# Altium integrated library FOC_64.IntLib: 72 symbols
Pins are listed as number, name and electrical type; pins without a type are passive.

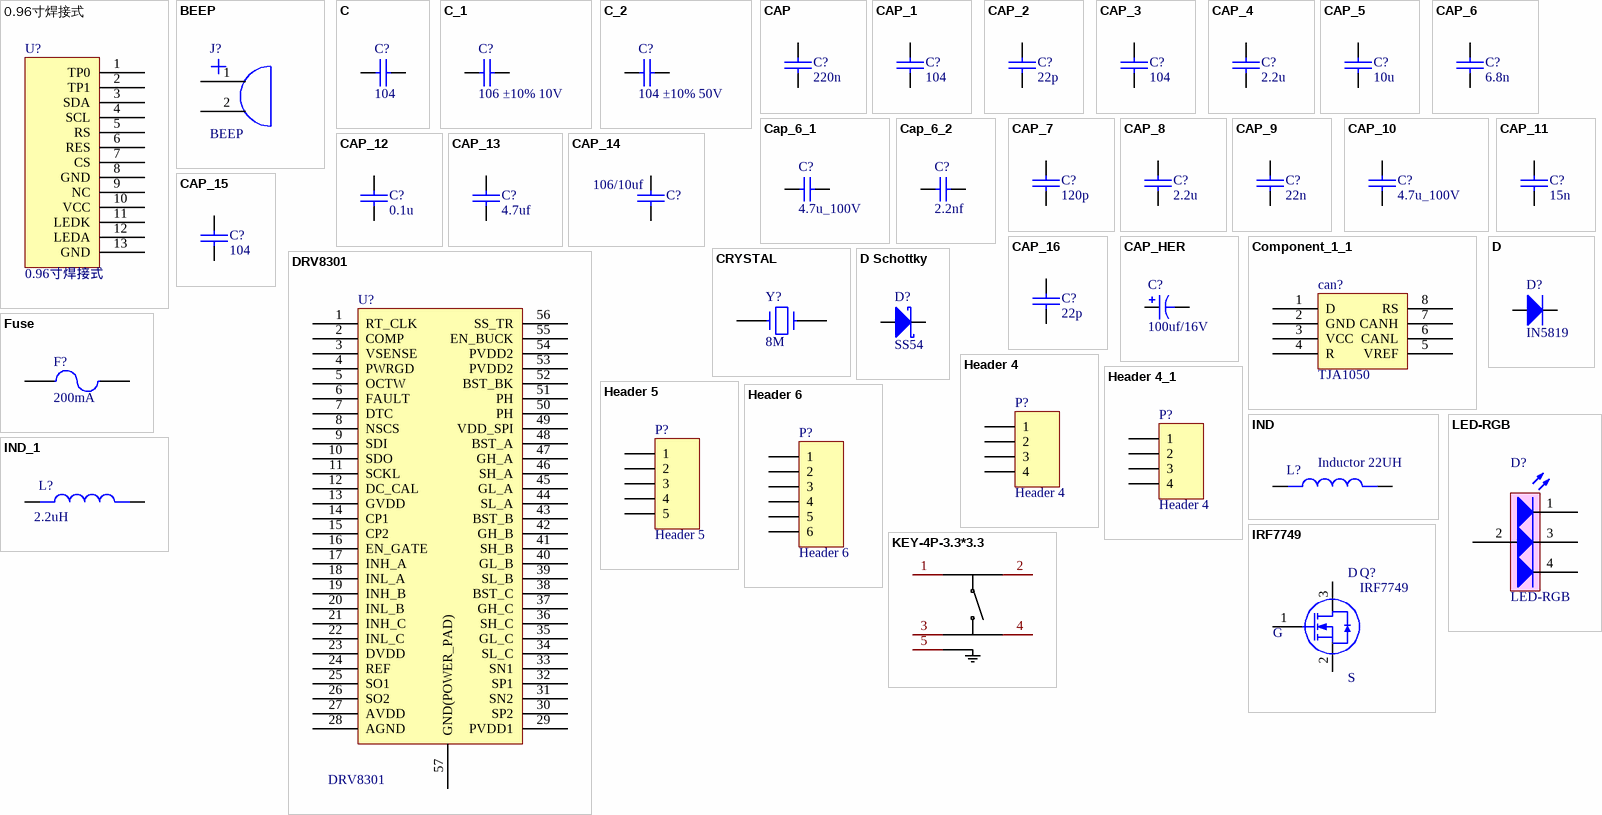
[diagram p0: symbols 0.96寸焊接式 to LED-RGB]

## 0.96寸焊接式
designator U?
footprint 13PIN-LCD
pins: 1 TP0, 2 TP1, 3 SDA, 4 SCL, 5 RS, 6 RES, 7 CS, 8 GND, 9 NC, 10 VCC, 11 LEDK, 12 LEDA, 13 GND

## BEEP
designator J?
蜂鸣器
footprint BUZZER_12.0X8.5MM
footprint 无源蜂鸣器5020
pins: 1 0, 2 1

## C
designator C?, comment 104
Capacitor
footprint cc0805
footprint 0805
footprint 0603
footprint C0603
footprint C0603-L
footprint c0805
footprint 0603_C (Capacitor)
footprint 0402
footprint 0402C
pins: 1, 2

## C_1
designator C?, comment 106 ±10% 10V
Capacitor
footprint cc0805
footprint 0805
footprint 0603
footprint C0603
footprint C0603-L
footprint c0805
footprint 0603_C (Capacitor)
footprint 0402
footprint 0402C
pins: 1, 2

## C_2
designator C?, comment 104 ±10% 50V
Capacitor
footprint cc0805
footprint 0805
footprint 0603
footprint C0603
footprint C0603-L
footprint c0805
footprint 0603_C (Capacitor)
footprint 0402
footprint 0402C
pins: 1, 2

## CAP
designator C?  value 220n  (hidden comment: CAP)
footprint 0603_C (Capacitor)
footprint 0805_C (Capacitor)
footprint 1206_C (Capacitor)
footprint 0402C
pins: 1, 2

## CAP_1
designator C?, comment value 104  (hidden comment: CAP)
footprint 0603_C (Capacitor)
footprint 0805_C (Capacitor)
footprint 1206_C (Capacitor)
footprint 0402C
pins: 1, 2

## CAP_2
designator C?, comment value 22p  (hidden comment: CAP)
footprint 0603_C (Capacitor)
footprint 0805_C (Capacitor)
footprint 1206_C (Capacitor)
pins: 1, 2

## CAP_3
designator C?, comment 104
Value: 104
footprint 0603_C (Capacitor)
footprint 0805_C (Capacitor)
footprint 1206_C (Capacitor)
footprint 0402C
pins: 1, 2

## CAP_4
designator C?, comment value 2.2u  (hidden comment: CAP)
footprint 0603_C (Capacitor)
footprint 0805_C (Capacitor)
footprint 1206_C (Capacitor)
footprint 0402C
pins: 1, 2

## CAP_5
designator C?, comment value 10u  (hidden comment: CAP)
footprint 0603_C (Capacitor)
footprint 0805_C (Capacitor)
footprint 1206_C (Capacitor)
footprint 0402C
pins: 1, 2

## CAP_6
designator C?, comment value 6.8n  (hidden comment: CAP)
footprint 0603_C (Capacitor)
footprint 0805_C (Capacitor)
footprint 1206_C (Capacitor)
footprint 0402C
pins: 1, 2

## Cap_6_1
designator C?, comment value 4.7u_100V  (hidden comment: Cap)
无极性电容; Published: 8-Jun-2000; LatestRevisionDate: 17-Jul-2002; LatestRevisionNote: Re-released for DXP Platform.; PackageReference: RAD-0.3; Publisher: Altium Limited
footprint C-RAD (瓷片电容)
footprint C-RAD-0805 (贴片电容)
footprint 0603_C (Capacitor)
footprint 0603-2 (贴片无丝印)
footprint 0805-2 (贴片无丝印)
footprint C-RAD-3528 (贴片电容)
footprint 1210_C
footprint 1206_C (Capacitor)
pins: 1, 2

## Cap_6_2
designator C?, comment value 2.2nf  (hidden comment: Cap)
无极性电容; Published: 8-Jun-2000; LatestRevisionDate: 17-Jul-2002; LatestRevisionNote: Re-released for DXP Platform.; PackageReference: RAD-0.3; Publisher: Altium Limited
footprint C-RAD (瓷片电容)
footprint C-RAD-0805 (贴片电容)
footprint 0603_C (Capacitor)
footprint 0603-2 (贴片无丝印)
footprint 0805-2 (贴片无丝印)
footprint C-RAD-3528 (贴片电容)
footprint 1210_C
footprint 0402C
pins: 1, 2

## CAP_7
designator C?, comment value 120p  (hidden comment: CAP)
footprint 0603_C (Capacitor)
footprint 0805_C (Capacitor)
footprint 1206_C (Capacitor)
footprint 0402C
pins: 1, 2

## CAP_8
designator C?, comment value 2.2u  (hidden comment: CAP)
footprint 0603_C (Capacitor)
footprint 0805_C (Capacitor)
footprint 1206_C (Capacitor)
footprint 0402C
pins: 1, 2

## CAP_9
designator C?, comment value 22n  (hidden comment: CAP)
footprint 0603_C (Capacitor)
footprint 0805_C (Capacitor)
footprint 1206_C (Capacitor)
footprint 0402C
pins: 1, 2

## CAP_10
designator C?, comment value 4.7u_100V  (hidden comment: CAP)
footprint 0603_C (Capacitor)
footprint 0805_C (Capacitor)
footprint 1206_C (Capacitor)
footprint 1210_C
footprint 0402C
pins: 1, 2

## CAP_11
designator C?, comment value 15n  (hidden comment: CAP)
footprint 0603_C (Capacitor)
footprint 0805_C (Capacitor)
footprint 1206_C (Capacitor)
footprint 0402C
pins: 1, 2

## CAP_12
designator C?, comment value 0.1u  (hidden comment: CAP)
footprint 0603_C (Capacitor)
footprint 0805_C (Capacitor)
footprint 1206_C (Capacitor)
footprint 0402C
footprint 0402C
pins: 1, 2

## CAP_13
designator C?, comment value 4.7uf  (hidden comment: CAP)
footprint 0603_C (Capacitor)
footprint 0805_C (Capacitor)
footprint 1206_C (Capacitor)
footprint 0402C
pins: 1, 2

## CAP_14
designator C?, comment value 106/10uf  (hidden comment: CAP)
footprint 0603_C (Capacitor)
footprint 0805_C (Capacitor)
footprint 1206_C (Capacitor)
footprint 0402C
footprint 0402C
pins: 1, 2

## CAP_15
designator C?, comment value 104  (hidden comment: CAP)
footprint 0603_C (Capacitor)
footprint 0805_C (Capacitor)
footprint 1206_C (Capacitor)
footprint 0402C
pins: 1, 2

## CAP_16
designator C?, comment value 22p  (hidden comment: CAP)
footprint 0603_C (Capacitor)
footprint 0805_C (Capacitor)
footprint 1206_C (Capacitor)
footprint 0402C
pins: 1, 2

## CAP_HER
designator C?  value 100uf/16V  (hidden comment: CAP_HER)
footprint CAP-1206 (贴片元件)
footprint CAP-3528 (钽电容)
footprint CAP-6032 (钽电容)
footprint CAP-8*16 (Connector; Header; 2 Position)
footprint CAP-3216 (钽电容)
footprint CAP-7343 (钽电容)
footprint CAP_ELEC_6.3x5.4 (Capacitor, polarized, aluminum can; 6.3x4.2mm DxH)
footprint CM D(6.3*5.4) (贴片电解电容，直径6.3mm，高5.4mm)
footprint CAP-SMD_L3.5-W2.8-R-RD (100uf)
footprint IND-SMD_L5.0-W5.0
footprint CAP-SMD_L3.5-W2.8-R-RD (100uf)
pins: 1, 2

## Component_1_1
designator can?, comment TJA1050
footprint TJA1050
footprint TJA1050
pins: 1 D, 2 GND, 3 VCC, 4 R, 5 VREF, 6 CANL, 7 CANH, 8 RS

## CRYSTAL
designator Y?, comment 8M
Crystal
footprint XTAL-3
footprint XTAL-32768
footprint OSC 5032-2P (5mm*3.2mm*0.8mm(长*宽*高))
footprint XTAL_SMD5032
footprint 晶振 (XTAL_SMD5032)
pins: 1, 2

## D
designator D?, comment IN5819
二极管
footprint D1206
footprint TVS 5V
pins: 1, 2

## D Schottky
designator D?, comment SS54
Schottky Diode; Published: 8-Jun-2000; LatestRevisionDate: 17-Jul-2002; LatestRevisionNote: Re-released for DXP Platform.; PackageReference: SMB; Publisher: Altium Limited; PackageDescription: DO-214-AA/SMB; 2 C-Bend Leads; Body 5.3 x 3.6 mm, inc. leads (LxW); Code_JEDEC: DO-214-AA
simulation model SKYDIODE (Diode)
signal-integrity model D Schottky
footprint DIODE_3*5.3
pins: 1 A, 2 K

## DRV8301
designator U?
三相整流桥芯片
footprint HTSSOP-56_L14.0-W6.0-P0.50-LS8.0-BL (DRV8301)
pins: 1 RT_CLK, 2 COMP, 3 VSENSE, 4 PWRGD, 5 OCTW, 6 FAULT, 7 DTC, 8 NSCS, 9 SDI, 10 SDO, 11 SCKL, 12 DC_CAL, 13 GVDD, 14 CP1, 15 CP2, 16 EN_GATE, 17 INH_A, 18 INL_A, 19 INH_B, 20 INL_B, 21 INH_C, 22 INL_C, 23 DVDD, 24 REF, 25 SO1, 26 SO2, 27 AVDD, 28 AGND, 29 PVDD1, 30 SP2, 31 SN2, 32 SP1, 33 SN1, 34 SL_C, 35 GL_C, 36 SH_C, 37 GH_C, 38 BST_C, 39 SL_B, 40 GL_B, 41 SH_B, 42 GH_B, 43 BST_B, 44 SL_A, 45 GL_A, 46 SH_A, 47 GH_A, 48 BST_A, 49 VDD_SPI, 50 PH, 51 PH, 52 BST_BK, 53 PVDD2, 54 PVDD2, 55 EN_BUCK, 56 SS_TR, 57 GND(POWER_PAD)

## Fuse
designator F?  value 200mA  (hidden comment: Fuse)
保险丝; Published: 8-Jun-2000; LatestRevisionDate: 17-Jul-2002; LatestRevisionNote: Re-released for DXP Platform.; PackageReference: PIN-W2/E2.8; Publisher: Altium Limited
footprint 0805_F
footprint 1206_F
pins: 1, 2

## Header 4
designator P?
Header, 4-Pin; LatestRevisionDate: 17-Jul-2002; LatestRevisionNote: Re-released for DXP Platform.; Publisher: Altium Limited
footprint HDR1X4 (Connector; Header; 4 Position)
footprint XH_4_V
footprint XH2.54-WS-4P (长：15mm，宽：8mm，高：6.1mm)
footprint XH2.54-WS-4P (长：15mm，宽：8mm，高：6.1mm)
footprint GH1.25-WT-3P (GH1.25 2P 卧贴插座)
footprint JST-SM04B-GHS-TB_V (SMD, 4-Leads, Body 8.25x4.05mm, Pitch 1.25mm)
footprint A1002WR-S-4P
pins: 1, 2, 3, 4

## Header 4_1
designator P?, comment Header 4
Header, 4-Pin; LatestRevisionDate: 17-Jul-2002; LatestRevisionNote: Re-released for DXP Platform.; Publisher: Altium Limited
footprint HDR1X4 (Connector; Header; 4 Position)
footprint XH_4_V
footprint XH2.54-WS-4P (长：15mm，宽：8mm，高：6.1mm)
footprint JST-SM04B-GHS-TB_V - duplicate (SMD, 4-Leads, Body 8.25x4.05mm, Pitch 1.25mm)
footprint JST-SM04B-GHS-TB_V (SMD, 4-Leads, Body 8.25x4.05mm, Pitch 1.25mm)
footprint A1002WR-S-4P
pins: 1, 2, 3, 4

## Header 5
designator P?
Header, 5-Pin; LatestRevisionDate: 17-Jul-2002; LatestRevisionNote: Re-released for DXP Platform.; Publisher: Altium Limited
footprint HDR1X5 (Connector; Header; 5 Position)
footprint XH_5_V
footprint A1002WR-S-5P
pins: 1, 2, 3, 4, 5

## Header 6
designator P?
Header, 6-Pin; LatestRevisionDate: 17-Jul-2002; LatestRevisionNote: Re-released for DXP Platform.; Publisher: Altium Limited
footprint HDR1X6 (Connector; Header; 6 Position)
footprint XH_6_V
footprint XH2.54-WS-6P (长：20mm，宽：8mm，高：6.1mm)
footprint JST-SM06B-GHS-TB_V (SMD, 6-Leads, Body 10.75x4.05mm, Pitch 1.25mm)
footprint A1002WR-S-6P
pins: 1, 2, 3, 4, 5, 6

## IND
designator L?, comment Inductor 22UH
footprint L_SOP74
footprint L_SOP127
footprint L_G_0810
footprint 0630 33uH
footprint L 0603 (贴片电感0603封装)
footprint 0603_R (Resistor)
footprint L-SMD-0630 (一体化成型电感)
footprint 22uHIND-SMD_L7.1-W6.6
footprint IND-SMD_L5.0-W5.0
pins: 1 Pri-, 2 Pri-

## IND_1
designator L?, comment 2.2uH
footprint L_SOP74
footprint L_SOP127
footprint L_G_0810
footprint 0630 33uH
footprint L 0603 (贴片电感0603封装)
footprint 0603_R (Resistor)
footprint L-SMD-0630 (一体化成型电感)
footprint 22uHIND-SMD_L7.1-W6.6
footprint IND-SMD_L5.0-W5.0
footprint IND-SMD_L4.4-W4.2
pins: 1 Pri-, 2 Pri-

## IRF7749
designator Q?
MOS(场效应管)
footprint DIRECTFET_L9.1-W7.0_IRF7759L2TRPBF
footprint IRF7480
pins: 1 G, 2 S, 3 D

## KEY-4P-3.3*3.3
designator SW?, comment TS3315A  (value not drawn)
Manufacturer: SHOU HAN(首韩); Add into BOM: yes; Circuit: 单刀单掷; Actuator Style: 圆形按钮; Switch Length: 3.3mm; Switch Height: 1.5mm; Contact Current: 50mA; Voltage Rating (DC): 12V; Operating Force: 5N; Name: TS3315A; Symbol: TS3315A; Device: TS3315A; LCSC Part Name: 3.3*3.3*1.5mm 立贴 轻触开关; Supplier Part: C412367; Manufacturer Part: TS3315A; Supplier Footprint: SMD,3.3x3.3mm; JLCPCB Part Class: Extended Part; Datasheet: https://atta.szlcsc.com/upload/public/pdf/source/20190816/C412367_ADDBB226FF931702D65874676D89E2B9.pdf; Supplier: LCSC; Convert to PCB: yes; Switch Width: 3.3mm; Strike Gundam: -; Voltage Rating (AC): -; Power Rating: -; Mounting Style: 立贴; Insulation Resistance: -; Actuator/Cap Color: -; With Lamp: -; IP Rating: -; Pin Style: -; Mechanical Life: -; Operating Temperature: -
footprint SW-SMD_4P-L3.4-W3.4-P2.00-LS4.0_TS3315A160GF
footprint SW-SMD_4P-L3.4-W3.4
pins: 1 A, 2 B, 3 C, 4 D, 5 GND

## LED-RGB
designator D?
三基色LED; Published: 8-Jun-2000; LatestRevisionDate: 08-Jul-2005; LatestRevisionNote: Mech Layer 1 removed.; PackageReference: LED-0; Publisher: Altium Limited
footprint PCBComponent_1
footprint RGB
pins: 1 R, 2 A, 3 G, 4 B

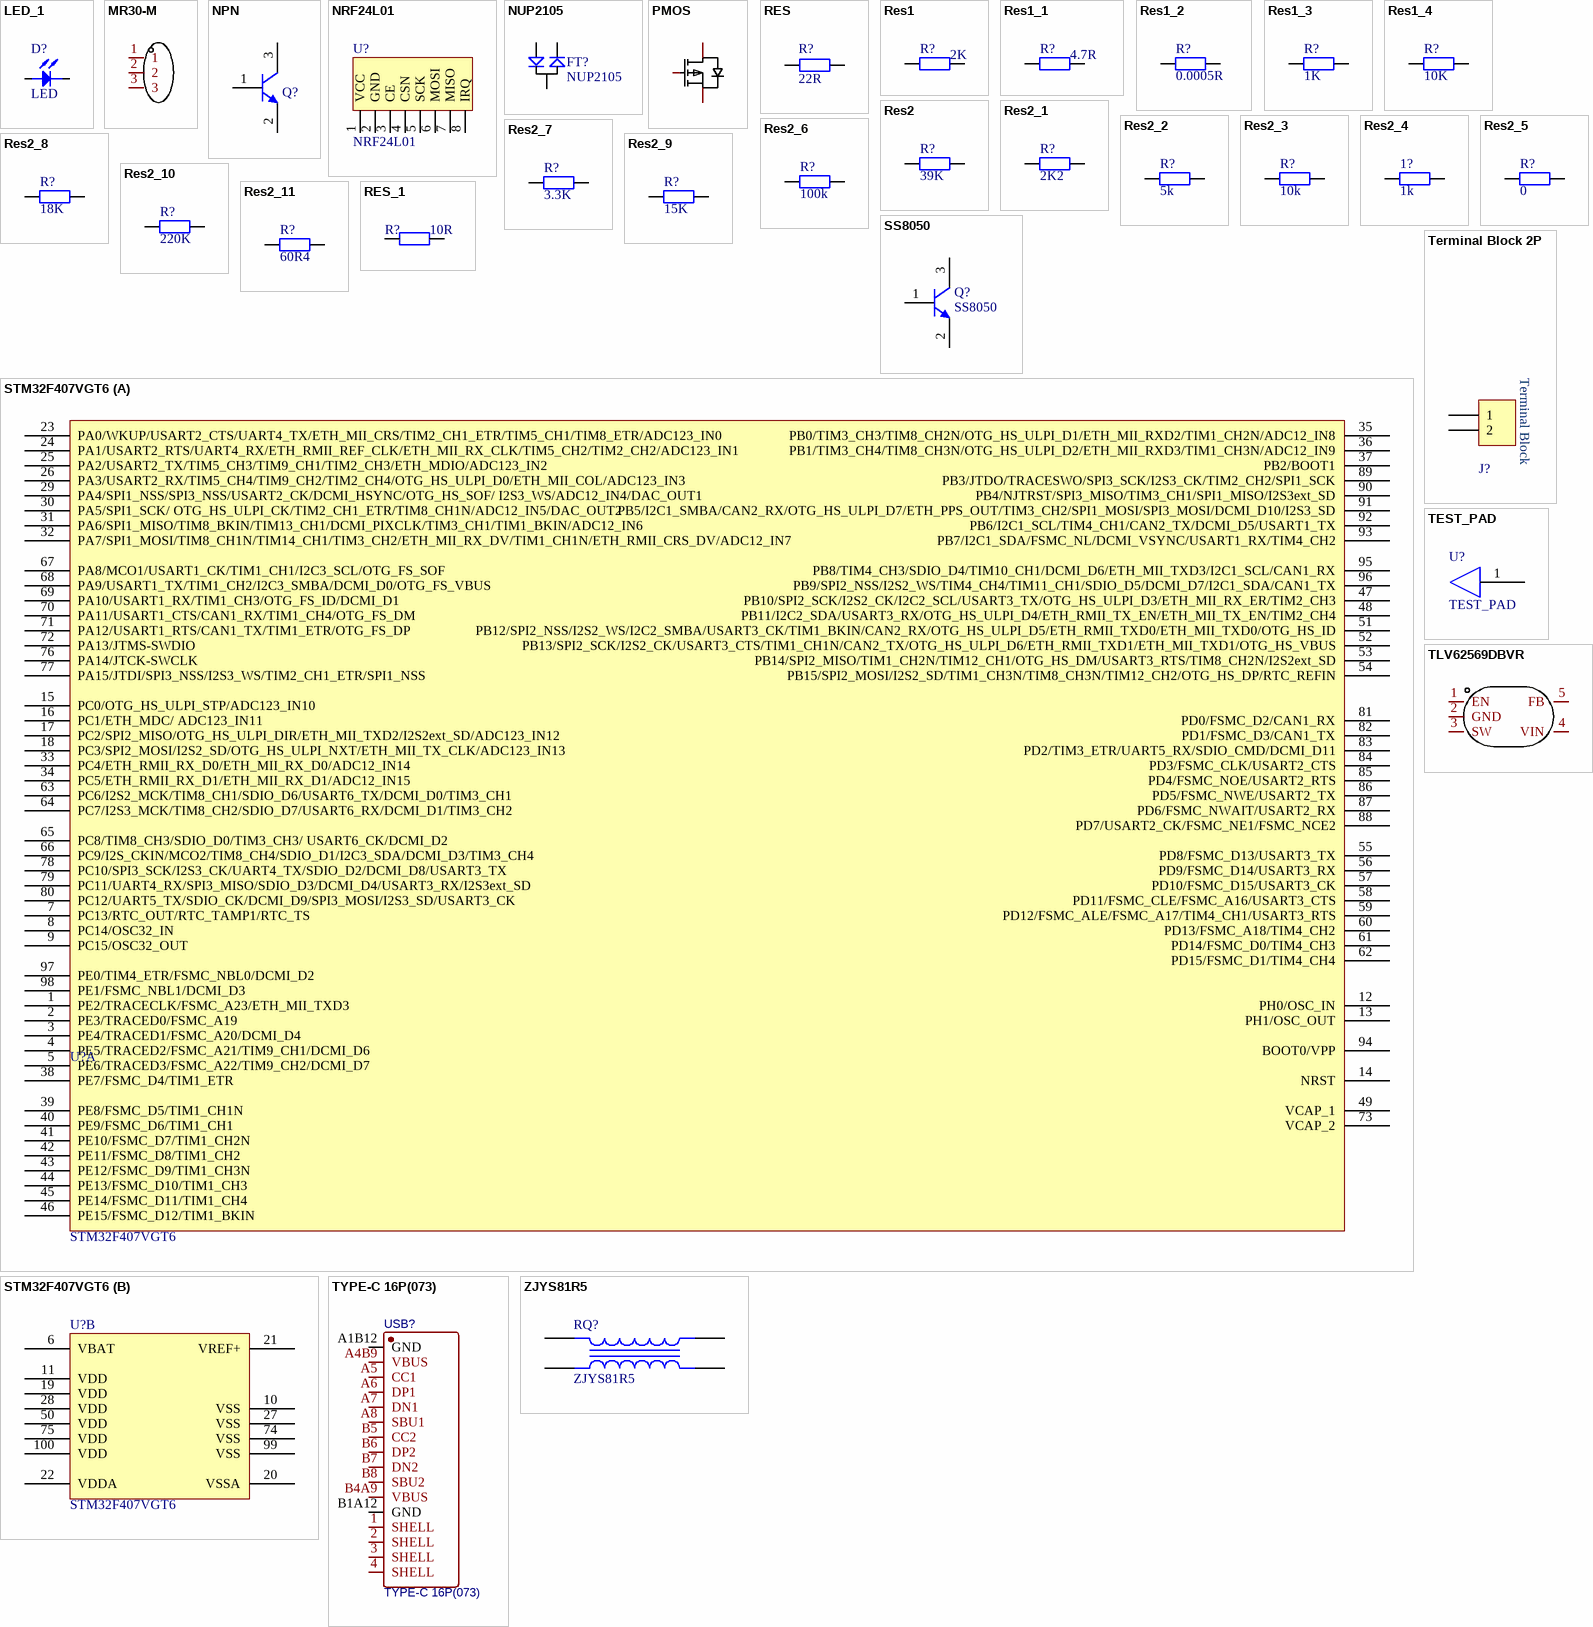
[diagram p1: symbols LED_1 to ZJYS81R5]

## LED_1
designator D?, comment LED
footprint 0805-LED-BLUE
footprint 0805-LED-GREEN
footprint 0805-LED-RED
pins: A, K

## MR30-M
designator U?  (value not drawn)
Manufacturer: AMASS(艾迈斯); Add into BOM: yes; Name: MR30-M; Symbol: MR30-M; Device: MR30-M; LCSC Part Name: MR30-M 两件套; Supplier Part: C99873; Manufacturer Part: MR30-M; Supplier Footprint: -; JLCPCB Part Class: Extended Part; Datasheet: https://atta.szlcsc.com/upload/public/pdf/source/20170412/1491969315720.pdf; Supplier: LCSC; Convert to PCB: yes
3D model CONN-TH_MR30-M
footprint MR30-M-SMD
footprint A1002WR-S-3P
footprint HDR2.54-LI-3P (排针，3脚)
footprint HDR2.54-LI-3P (排针，3脚)
footprint HDR2.54-LI-3P (排针，3脚)
pins: 1, 2, 3

## NPN
designator Q?  (value not drawn)
footprint TO-92
footprint SOT-23Q
pins: 1 B, 2 E, 3 C

## NRF24L01
designator U?
footprint NRF24L01_H
footprint NRF24L01_H
footprint NRF24L01mini
footprint NRF24L01mini
footprint NRF24L01mini
pins: 1 VCC, 2 GND, 3 CE, 4 CSN, 5 SCK, 6 MOSI, 7 MISO, 8 IRQ

## NUP2105
designator FT?
footprint sot-23
footprint SOT-23Q
pins: 1, 2, 3

## PMOS
designator Q?, comment AO3401_C727156  (value not drawn)
Manufacturer: TWGMC(台湾迪嘉); Name: AO3401; Add into BOM: yes; Type: P沟道; Drain Source Voltage (Vdss): 30V; Continuous Drain Current (Id): 4.2A; Power Dissipation (Pd): 350mW; Drain Source On Resistance (RDS(on)@Vgs,Id): 65mΩ@10V,4.2A; Gate Threshold Voltage (Vgs(th)@Id): 1.3V@250uA; Symbol: AO3401_C727156; Device: AO3401_C727156; LCSC Part Name: P沟道 耐压:30V 电流:4.2A; Supplier Part: C727156; Manufacturer Part: AO3401; Supplier Footprint: SOT-23; JLCPCB Part Class: Extended Part; Datasheet: https://atta.szlcsc.com/upload/public/pdf/source/20200827/C727156_6E081BBEEFBC6B8FEE164CB196B0AF30.pdf; Supplier: LCSC; Convert to PCB: yes; Total Gate Charge (Qg@Vgs): -; Input Capacitance (Ciss@Vds): -; Reverse Transfer Capacitance (Crss@Vds): -; Operating Temperature: -
footprint SOT-23-3_L2.9-W1.4-P1.90-LS2.6-BR
3D model SOT-23-3_L2.9-W1.4-P1.90-LS2.6-BR
footprint SOT-23Q
pins: 1 G, 2 S, 3 D

## RES
designator R?, comment 22R
贴片电阻
footprint R 0603 (贴片电阻0603封装)
footprint R 0805 (贴片电阻0805封装)
footprint R 1206 (贴片电阻1206封装)
footprint 0603_R (Resistor)
footprint 0402R
pins: 1, 2

## Res1
designator R?  value 2K  (hidden comment: Res1)
贴片电阻; Published: 8-Jun-2000; LatestRevisionDate: 17-Jul-2002; LatestRevisionNote: Re-released for DXP Platform.; PackageReference: AXIAL-0.4; Publisher: Altium Limited
footprint 0805-1 (贴片带丝印)
footprint 0805-2 (贴片无丝印)
footprint 0603_R (Resistor)
footprint 1210 (贴片元件)
footprint AXIAL-0.8 (Semiconductor Resistor; 2 Leads)
footprint 2010 (贴片电阻)
footprint 0603-2 (贴片无丝印)
footprint 1206
footprint 2512 (保险丝)
footprint 1812 (保险丝)
footprint AXIAL-0.9 (插件电阻)
footprint 0402R
pins: 1, 2

## Res1_1
designator R?, comment value 4.7R  (hidden comment: Res1)
贴片电阻; Published: 8-Jun-2000; LatestRevisionDate: 17-Jul-2002; LatestRevisionNote: Re-released for DXP Platform.; PackageReference: AXIAL-0.4; Publisher: Altium Limited
footprint 0805-1 (贴片带丝印)
footprint 0805-2 (贴片无丝印)
footprint 0603_R (Resistor)
footprint 1210 (贴片元件)
footprint AXIAL-0.8 (Semiconductor Resistor; 2 Leads)
footprint 2010 (贴片电阻)
footprint 0603-2 (贴片无丝印)
footprint 1206
footprint 2512 (保险丝)
footprint 1812 (保险丝)
footprint AXIAL-0.9 (插件电阻)
footprint 0402R
pins: 1, 2

## Res1_2
designator R?, comment value 0.0005R  (hidden comment: Res1)
贴片电阻; Published: 8-Jun-2000; LatestRevisionDate: 17-Jul-2002; LatestRevisionNote: Re-released for DXP Platform.; PackageReference: AXIAL-0.4; Publisher: Altium Limited
footprint 0805-1 (贴片带丝印)
footprint 0805-2 (贴片无丝印)
footprint 0603_R (Resistor)
footprint 1210 (贴片元件)
footprint AXIAL-0.8 (Semiconductor Resistor; 2 Leads)
footprint 2010 (贴片电阻)
footprint 0603-2 (贴片无丝印)
footprint 1206
footprint 2512 (保险丝)
footprint 1812 (保险丝)
footprint AXIAL-0.9 (插件电阻)
footprint 0.5mr
footprint 0.5mr_6W
pins: 1, 2

## Res1_3
designator R?, comment value 1K  (hidden comment: Res1)
贴片电阻; Published: 8-Jun-2000; LatestRevisionDate: 17-Jul-2002; LatestRevisionNote: Re-released for DXP Platform.; PackageReference: AXIAL-0.4; Publisher: Altium Limited
footprint 0805-1 (贴片带丝印)
footprint 0805-2 (贴片无丝印)
footprint 0603-1 (贴片带丝印)
footprint 1210 (贴片元件)
footprint AXIAL-0.8 (Semiconductor Resistor; 2 Leads)
footprint 2010 (贴片电阻)
footprint 0603-2 (贴片无丝印)
footprint 1206
footprint 2512 (保险丝)
footprint 1812 (保险丝)
footprint AXIAL-0.9 (插件电阻)
footprint 0603_R (Resistor)
footprint 0402R
pins: 1, 2

## Res1_4
designator R?, comment value 10K  (hidden comment: Res1)
贴片电阻; Published: 8-Jun-2000; LatestRevisionDate: 17-Jul-2002; LatestRevisionNote: Re-released for DXP Platform.; PackageReference: AXIAL-0.4; Publisher: Altium Limited
footprint 0805-1 (贴片带丝印)
footprint 0805-2 (贴片无丝印)
footprint 0603-1 (贴片带丝印)
footprint 1210 (贴片元件)
footprint AXIAL-0.8 (Semiconductor Resistor; 2 Leads)
footprint 2010 (贴片电阻)
footprint 0603-2 (贴片无丝印)
footprint 1206
footprint 2512 (保险丝)
footprint 1812 (保险丝)
footprint AXIAL-0.9 (插件电阻)
footprint 0603_R (Resistor)
footprint 0402R
pins: 1, 2

## Res2
designator R?, comment 39K
Resistor; Value: 10K; Published: 8-Jun-2000; LatestRevisionDate: 17-Jul-2002; LatestRevisionNote: Re-released for DXP Platform.; PackageReference: AXIAL-0.4; Publisher: Altium Limited; PackageDescription: Axial Device, Thru-Hole; 2 Leads; 0.4 in Pin Spacing
footprint 0805
simulation model RESISTOR (Resistor)
signal-integrity model Res
footprint 0603
footprint 0603-l
footprint 0402
footprint 0603_R (Resistor)
footprint 0805_R (Resistor)
footprint 0402R
footprint 0402R
pins: 1, 2

## Res2_1
designator R?, comment 2K2
Resistor; Value: 10K; Published: 8-Jun-2000; LatestRevisionDate: 17-Jul-2002; LatestRevisionNote: Re-released for DXP Platform.; PackageReference: AXIAL-0.4; Publisher: Altium Limited; PackageDescription: Axial Device, Thru-Hole; 2 Leads; 0.4 in Pin Spacing
footprint 0805
simulation model RESISTOR (Resistor)
signal-integrity model Res
footprint 0603
footprint 0603-l
footprint 0402
footprint 0603_R (Resistor)
footprint 0805_R (Resistor)
footprint 0402R
pins: 1, 2

## Res2_2
designator R?, comment 5k
Resistor; Value: 10K; Published: 8-Jun-2000; LatestRevisionDate: 17-Jul-2002; LatestRevisionNote: Re-released for DXP Platform.; PackageReference: AXIAL-0.4; Publisher: Altium Limited; PackageDescription: Axial Device, Thru-Hole; 2 Leads; 0.4 in Pin Spacing
simulation model RESISTOR (Resistor)
signal-integrity model Res
footprint 0603_R (Resistor)
pins: 1, 2

## Res2_3
designator R?, comment 10k
Resistor; Published: 8-Jun-2000; LatestRevisionDate: 17-Jul-2002; LatestRevisionNote: Re-released for DXP Platform.; PackageReference: AXIAL-0.4; Publisher: Altium Limited; PackageDescription: Axial Device, Thru-Hole; 2 Leads; 0.4 in Pin Spacing; Value: 10K
footprint 0805
simulation model RESISTOR (Resistor)
signal-integrity model Res
footprint 0603
footprint 0603-l
footprint 0402
footprint 0603_R (Resistor)
footprint 0402R
footprint 0402R
pins: 1, 2

## Res2_4
designator 1?, comment 1k
Resistor; Value: 10K; Published: 8-Jun-2000; LatestRevisionDate: 17-Jul-2002; LatestRevisionNote: Re-released for DXP Platform.; PackageReference: AXIAL-0.4; Publisher: Altium Limited; PackageDescription: Axial Device, Thru-Hole; 2 Leads; 0.4 in Pin Spacing
footprint 0805
simulation model RESISTOR (Resistor)
signal-integrity model Res
footprint 0603
footprint 0603-l
footprint 0402
footprint 0603_R (Resistor)
footprint 0402C
pins: 1, 2

## Res2_5
designator R?, comment 0
Resistor; Value: 10K; Published: 8-Jun-2000; LatestRevisionDate: 17-Jul-2002; LatestRevisionNote: Re-released for DXP Platform.; PackageReference: AXIAL-0.4; Publisher: Altium Limited; PackageDescription: Axial Device, Thru-Hole; 2 Leads; 0.4 in Pin Spacing
footprint 0805
simulation model RESISTOR (Resistor)
signal-integrity model Res
footprint 0603
footprint 0603-l
footprint 0402
footprint 0603_R (Resistor)
footprint 0402C
footprint 0402R
pins: 1, 2

## Res2_6
designator R?, comment 100k
Resistor; Value: 10K; Published: 8-Jun-2000; LatestRevisionDate: 17-Jul-2002; LatestRevisionNote: Re-released for DXP Platform.; PackageReference: AXIAL-0.4; Publisher: Altium Limited; PackageDescription: Axial Device, Thru-Hole; 2 Leads; 0.4 in Pin Spacing
footprint 0805
simulation model RESISTOR (Resistor)
signal-integrity model Res
footprint 0603
footprint 0603-l
footprint 0402
footprint 0603_R (Resistor)
footprint 0402R
pins: 1, 2

## Res2_7
designator R?, comment 3.3K
Resistor; Value: 10K; Published: 8-Jun-2000; LatestRevisionDate: 17-Jul-2002; LatestRevisionNote: Re-released for DXP Platform.; PackageReference: AXIAL-0.4; Publisher: Altium Limited; PackageDescription: Axial Device, Thru-Hole; 2 Leads; 0.4 in Pin Spacing
footprint 0805
simulation model RESISTOR (Resistor)
signal-integrity model Res
footprint 0603
footprint 0603-l
footprint 0402
footprint 0603_R (Resistor)
footprint 0402C
footprint 0402R
pins: 1, 2

## Res2_8
designator R?, comment 18K
Resistor; Value: 10K; Published: 8-Jun-2000; LatestRevisionDate: 17-Jul-2002; LatestRevisionNote: Re-released for DXP Platform.; PackageReference: AXIAL-0.4; Publisher: Altium Limited; PackageDescription: Axial Device, Thru-Hole; 2 Leads; 0.4 in Pin Spacing
footprint 0805
simulation model RESISTOR (Resistor)
signal-integrity model Res
footprint 0603
footprint 0603-l
footprint 0402
footprint 0603_R (Resistor)
footprint 0402C
footprint 0402R
pins: 1, 2

## Res2_9
designator R?, comment 15K
Resistor; Value: 10K; Published: 8-Jun-2000; LatestRevisionDate: 17-Jul-2002; LatestRevisionNote: Re-released for DXP Platform.; PackageReference: AXIAL-0.4; Publisher: Altium Limited; PackageDescription: Axial Device, Thru-Hole; 2 Leads; 0.4 in Pin Spacing
footprint 0805
simulation model RESISTOR (Resistor)
signal-integrity model Res
footprint 0603
footprint 0603-l
footprint 0402
footprint 0603_R (Resistor)
footprint 0402C
footprint 0402R
pins: 1, 2

## Res2_10
designator R?, comment 220K
Resistor; Value: 10K; Published: 8-Jun-2000; LatestRevisionDate: 17-Jul-2002; LatestRevisionNote: Re-released for DXP Platform.; PackageReference: AXIAL-0.4; Publisher: Altium Limited; PackageDescription: Axial Device, Thru-Hole; 2 Leads; 0.4 in Pin Spacing
footprint 0805
simulation model RESISTOR (Resistor)
signal-integrity model Res
footprint 0603
footprint 0603-l
footprint 0402
footprint 0603_R (Resistor)
footprint 0402C
footprint 0402R
pins: 1, 2

## Res2_11
designator R?, comment 60R4
Resistor; Value: 10K; Published: 8-Jun-2000; LatestRevisionDate: 17-Jul-2002; LatestRevisionNote: Re-released for DXP Platform.; PackageReference: AXIAL-0.4; Publisher: Altium Limited; PackageDescription: Axial Device, Thru-Hole; 2 Leads; 0.4 in Pin Spacing
footprint 0805
simulation model RESISTOR (Resistor)
signal-integrity model Res
footprint 0603
footprint 0603_R (Resistor)
footprint 0402
footprint 0402R
pins: 1, 2

## RES_1
designator R?, comment 10R
Resistor
footprint SMD0805
footprint 0603
footprint 0603-L
footprint 0805
footprint R0805
footprint R0603
footprint 0603_R (Resistor)
footprint 0402
footprint 0402R
pins: 1, 2

## SS8050
designator Q?
NPN贴片三极管; Published: 8-Jun-2000; LatestRevisionDate: 15-Jan-2003; LatestRevisionNote: PCB Footprint 'BCY-W3/D4.7' replaced; DatasheetDocument: 1997; PackageDocument: Sep-1998; PackageReference: TO-92A; Publisher: Altium Limited; Code_JEDEC: TO-92A; ComponentLink1Description: Manufacturer Link; ComponentLink1URL: http://www.fairchildsemi.com/; ComponentLink2Description: Datasheet; ComponentLink2URL: http://www.fairchildsemi.com/ds/2N%2F2N3904.pdf
footprint SOT-23 (普通贴片三极管)
footprint SOT-23Q
pins: 1 B, 2 E, 3 C

## STM32F407VGT6
designator U?
footprint LQFP-100_L14.0-W14.0-P0.50-LS16.0-BL
part A pins: 1 PE2/TRACECLK/FSMC_A23/ETH_MII_TXD3, 2 PE3/TRACED0/FSMC_A19, 3 PE4/TRACED1/FSMC_A20/DCMI_D4, 4 PE5/TRACED2/FSMC_A21/TIM9_CH1/DCMI_D6, 5 PE6/TRACED3/FSMC_A22/TIM9_CH2/DCMI_D7, 7 PC13/RTC_OUT/RTC_TAMP1/RTC_TS, 8 PC14/OSC32_IN, 9 PC15/OSC32_OUT, 12 PH0/OSC_IN, 13 PH1/OSC_OUT, 14 NRST, 15 PC0/OTG_HS_ULPI_STP/ADC123_IN10, 16 PC1/ETH_MDC/ ADC123_IN11, 17 PC2/SPI2_MISO/OTG_HS_ULPI_DIR/ETH_MII_TXD2/I2S2ext_SD/ADC123_IN12, 18 PC3/SPI2_MOSI/I2S2_SD/OTG_HS_ULPI_NXT/ETH_MII_TX_CLK/ADC123_IN13, 23 PA0/WKUP/USART2_CTS/UART4_TX/ETH_MII_CRS/TIM2_CH1_ETR/TIM5_CH1/TIM8_ETR/ADC123_IN0, 24 PA1/USART2_RTS/UART4_RX/ETH_RMII_REF_CLK/ETH_MII_RX_CLK/TIM5_CH2/TIM2_CH2/ADC123_IN1, 25 PA2/USART2_TX/TIM5_CH3/TIM9_CH1/TIM2_CH3/ETH_MDIO/ADC123_IN2, 26 PA3/USART2_RX/TIM5_CH4/TIM9_CH2/TIM2_CH4/OTG_HS_ULPI_D0/ETH_MII_COL/ADC123_IN3, 29 PA4/SPI1_NSS/SPI3_NSS/USART2_CK/DCMI_HSYNC/OTG_HS_SOF/ I2S3_WS/ADC12_IN4/DAC_OUT1, 30 PA5/SPI1_SCK/ OTG_HS_ULPI_CK/TIM2_CH1_ETR/TIM8_CH1N/ADC12_IN5/DAC_OUT2, 31 PA6/SPI1_MISO/TIM8_BKIN/TIM13_CH1/DCMI_PIXCLK/TIM3_CH1/TIM1_BKIN/ADC12_IN6, 32 PA7/SPI1_MOSI/TIM8_CH1N/TIM14_CH1/TIM3_CH2/ETH_MII_RX_DV/TIM1_CH1N/ETH_RMII_CRS_DV/ADC12_IN7, 33 PC4/ETH_RMII_RX_D0/ETH_MII_RX_D0/ADC12_IN14, 34 PC5/ETH_RMII_RX_D1/ETH_MII_RX_D1/ADC12_IN15, 35 PB0/TIM3_CH3/TIM8_CH2N/OTG_HS_ULPI_D1/ETH_MII_RXD2/TIM1_CH2N/ADC12_IN8, 36 PB1/TIM3_CH4/TIM8_CH3N/OTG_HS_ULPI_D2/ETH_MII_RXD3/TIM1_CH3N/ADC12_IN9, 37 PB2/BOOT1, 38 PE7/FSMC_D4/TIM1_ETR, 39 PE8/FSMC_D5/TIM1_CH1N, 40 PE9/FSMC_D6/TIM1_CH1, 41 PE10/FSMC_D7/TIM1_CH2N, 42 PE11/FSMC_D8/TIM1_CH2, 43 PE12/FSMC_D9/TIM1_CH3N, 44 PE13/FSMC_D10/TIM1_CH3, 45 PE14/FSMC_D11/TIM1_CH4, 46 PE15/FSMC_D12/TIM1_BKIN, 47 PB10/SPI2_SCK/I2S2_CK/I2C2_SCL/USART3_TX/OTG_HS_ULPI_D3/ETH_MII_RX_ER/TIM2_CH3, 48 PB11/I2C2_SDA/USART3_RX/OTG_HS_ULPI_D4/ETH_RMII_TX_EN/ETH_MII_TX_EN/TIM2_CH4, 49 VCAP_1, 51 PB12/SPI2_NSS/I2S2_WS/I2C2_SMBA/USART3_CK/TIM1_BKIN/CAN2_RX/OTG_HS_ULPI_D5/ETH_RMII_TXD0/ETH_MII_TXD0/OTG_HS_ID, 52 PB13/SPI2_SCK/I2S2_CK/USART3_CTS/TIM1_CH1N/CAN2_TX/OTG_HS_ULPI_D6/ETH_RMII_TXD1/ETH_MII_TXD1/OTG_HS_VBUS, 53 PB14/SPI2_MISO/TIM1_CH2N/TIM12_CH1/OTG_HS_DM/USART3_RTS/TIM8_CH2N/I2S2ext_SD, 54 PB15/SPI2_MOSI/I2S2_SD/TIM1_CH3N/TIM8_CH3N/TIM12_CH2/OTG_HS_DP/RTC_REFIN, 55 PD8/FSMC_D13/USART3_TX, 56 PD9/FSMC_D14/USART3_RX, 57 PD10/FSMC_D15/USART3_CK, 58 PD11/FSMC_CLE/FSMC_A16/USART3_CTS, 59 PD12/FSMC_ALE/FSMC_A17/TIM4_CH1/USART3_RTS, 60 PD13/FSMC_A18/TIM4_CH2, 61 PD14/FSMC_D0/TIM4_CH3, 62 PD15/FSMC_D1/TIM4_CH4, 63 PC6/I2S2_MCK/TIM8_CH1/SDIO_D6/USART6_TX/DCMI_D0/TIM3_CH1, 64 PC7/I2S3_MCK/TIM8_CH2/SDIO_D7/USART6_RX/DCMI_D1/TIM3_CH2, 65 PC8/TIM8_CH3/SDIO_D0/TIM3_CH3/ USART6_CK/DCMI_D2, 66 PC9/I2S_CKIN/MCO2/TIM8_CH4/SDIO_D1/I2C3_SDA/DCMI_D3/TIM3_CH4, 67 PA8/MCO1/USART1_CK/TIM1_CH1/I2C3_SCL/OTG_FS_SOF, 68 PA9/USART1_TX/TIM1_CH2/I2C3_SMBA/DCMI_D0/OTG_FS_VBUS, 69 PA10/USART1_RX/TIM1_CH3/OTG_FS_ID/DCMI_D1, 70 PA11/USART1_CTS/CAN1_RX/TIM1_CH4/OTG_FS_DM, 71 PA12/USART1_RTS/CAN1_TX/TIM1_ETR/OTG_FS_DP, 72 PA13/JTMS-SWDIO, 73 VCAP_2, 76 PA14/JTCK-SWCLK, 77 PA15/JTDI/SPI3_NSS/I2S3_WS/TIM2_CH1_ETR/SPI1_NSS, 78 PC10/SPI3_SCK/I2S3_CK/UART4_TX/SDIO_D2/DCMI_D8/USART3_TX, 79 PC11/UART4_RX/SPI3_MISO/SDIO_D3/DCMI_D4/USART3_RX/I2S3ext_SD, 80 PC12/UART5_TX/SDIO_CK/DCMI_D9/SPI3_MOSI/I2S3_SD/USART3_CK, 81 PD0/FSMC_D2/CAN1_RX, 82 PD1/FSMC_D3/CAN1_TX, 83 PD2/TIM3_ETR/UART5_RX/SDIO_CMD/DCMI_D11, 84 PD3/FSMC_CLK/USART2_CTS, 85 PD4/FSMC_NOE/USART2_RTS, 86 PD5/FSMC_NWE/USART2_TX, 87 PD6/FSMC_NWAIT/USART2_RX, 88 PD7/USART2_CK/FSMC_NE1/FSMC_NCE2, 89 PB3/JTDO/TRACESWO/SPI3_SCK/I2S3_CK/TIM2_CH2/SPI1_SCK, 90 PB4/NJTRST/SPI3_MISO/TIM3_CH1/SPI1_MISO/I2S3ext_SD, 91 PB5/I2C1_SMBA/CAN2_RX/OTG_HS_ULPI_D7/ETH_PPS_OUT/TIM3_CH2/SPI1_MOSI/SPI3_MOSI/DCMI_D10/I2S3_SD, 92 PB6/I2C1_SCL/TIM4_CH1/CAN2_TX/DCMI_D5/USART1_TX, 93 PB7/I2C1_SDA/FSMC_NL/DCMI_VSYNC/USART1_RX/TIM4_CH2, 94 BOOT0/VPP, 95 PB8/TIM4_CH3/SDIO_D4/TIM10_CH1/DCMI_D6/ETH_MII_TXD3/I2C1_SCL/CAN1_RX, 96 PB9/SPI2_NSS/I2S2_WS/TIM4_CH4/TIM11_CH1/SDIO_D5/DCMI_D7/I2C1_SDA/CAN1_TX, 97 PE0/TIM4_ETR/FSMC_NBL0/DCMI_D2, 98 PE1/FSMC_NBL1/DCMI_D3
part B pins: 6 VBAT, 10 VSS, 11 VDD, 19 VDD, 20 VSSA, 21 VREF+, 22 VDDA, 27 VSS, 28 VDD, 50 VDD, 74 VSS, 75 VDD, 99 VSS, 100 VDD

## Terminal Block 2P
designator J?  (value not drawn)
footprint DG1282-5.0
footprint 5.08_W
footprint HDR2X1_C (3.81接插件)
footprint 3.81端子
footprint JST-SM02B-GHS-TB_V (SMD, 2-Leads, Body 5.75x4.05mm, Pitch 1.25mm)
footprint A1002WR-S-2P
pins: 1, 2
text: Terminal Block

## TEST_PAD
designator U?
footprint TEST_PAD
pins: 1 2

## TLV62569DBVR
designator U?  (value not drawn)
Manufacturer: TI(德州仪器); Add into BOM: yes; Function: 降压型; Synchronous Rectification: 是; Output Type: 可调; Topology: 降压式; Input Voltage: 2.5V~5.5V; Output Voltage: 600mV~5.5V; Output Current (Max): 2A; Switching Frequency: 1.5MHz; Name: TLV62569DBVR; Symbol: TLV62569DBVR; Device: TLV62569DBVR; LCSC Part Name: 降压型 输入2.5V~5.5V 输出600mV~5.5V 2A; Supplier Part: C141836; Manufacturer Part: TLV62569DBVR; Supplier Footprint: SOT-23-5; JLCPCB Part Class: Extended Part; Datasheet: https://atta.szlcsc.com/upload/public/pdf/source/20180423/C141836_1FC17A3D2C2E4ECD339DF92B83CED618.pdf; Supplier: LCSC; Convert to PCB: yes; Number of Outputs: -; Operating Temperature: -40℃~+125℃@(TJ)
footprint SOT-23-5_L3.0-W1.7-P0.95-LS2.8-BR
3D model SOT-23-5_L2.9-W1.6-H1.1-LS2.8-P0.95
footprint SOT-23-5_L3.0-W1.7-P0.95-LS2.8-BR
pins: 1 EN, 2 GND, 3 SW, 4 VIN, 5 FB

## TYPE-C 16P(073)
designator USB?
BOM_Manufacturer: SHOU HAN; Contributor: LCSC; BOM_Supplier: LCSC; BOM_Supplier Part: C668624; BOM_Manufacturer Part: TYPE-C 16P(073); spicePre: U; spiceSymbolName: TYPE-C 16P(073)
footprint USB-C-SMD_TYPE-C16PIN_C668624
footprint USB-C-SMD_TYPE-C16PIN_C668624
footprint USB-C-SMD_TYPE-C16PIN_C668624
footprint USB-C-SMD_TYPE-C16PIN
footprint USB-C-SMD_16P - duplicate2
pins: 1 SHELL, 2 SHELL, 3 SHELL, 4 SHELL, A1B12 GND, A4B9 VBUS, A5 CC1, A6 DP1, A7 DN1, A8 SBU1, B1A12 GND, B4A9 VBUS, B5 CC2, B6 DP2, B7 DN2, B8 SBU2

## ZJYS81R5
designator RQ?
共模滤波器
footprint SOP4-2.54 (间距2.54mm（蒜米工坊）)
pins: 1, 2, 3, 4